# Altium footprint library connector.PcbLib: 227 footprints (part 14 of 15)
Each footprint in its own frame and in the unit in brackets; x right, y up, seen from the top. Pads: shape width x height; smd on the part's side, far side on the other; paste and mask are expansions set on the pad; w line width, h text height; cw(c..) or ccw(c..) is an arc to the next point about the centre after c.
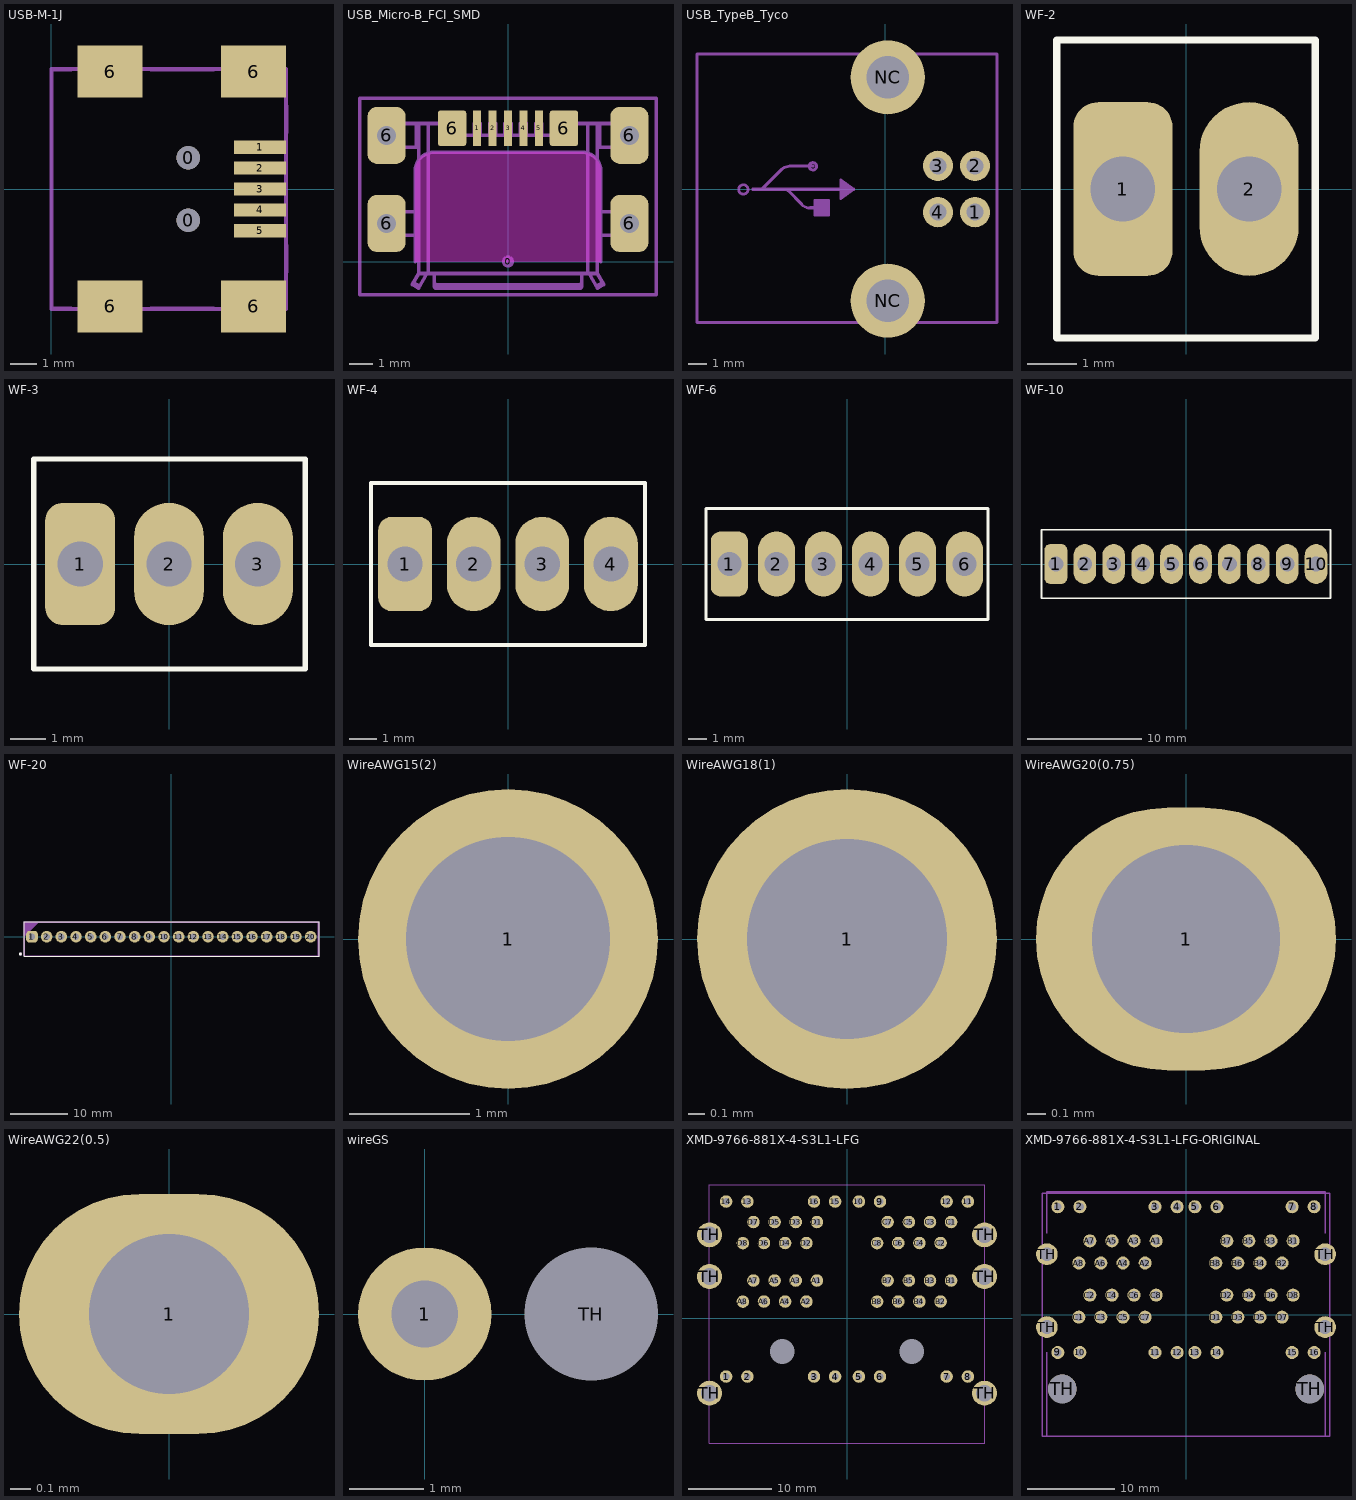
[diagram p13: the footprints below, top view; thin cyan lines are the x and y axes]

## USB-M-1J [mm]
height 4
pads (11):
  round 0.9 hole 0.9: 0(5.25,-1.2) 0(5.25,1.2)
  rect 2x0.5 smd: 1(8.001,1.6) 2(8.001,0.8) 3(8.001,0) 4(8.001,-0.8) 5(8.001,-1.6)
  rect 2.5x2 smd: 6(2.25,-4.5) 6(2.25,4.5) 6(7.75,-4.5) 6(7.75,4.5)
Mechanical 29:
  lines w0.15: 0.762,-4.572 0,-4.572 0,0 0,4.572 0.762,4.572 ; 3.81,-4.572 6.223,-4.572 ; 3.81,4.572 6.223,4.572 ; 9.017,-3.175 9.017,-2.159 ; 9.017,2.159 9.017,3.175 ; 0,-4.6 9,-4.6 9,4.6 0,4.6 0,-4.6
  text ".Designator" at 0.5,-0.3 h1

## USB_Micro-B_FCI_SMD [mm]
height 2.286
pads (12):
  round 0.508 on Mech15: 0(0,0)
  rrect20% 0.35x1.5 smd: 1(-1.3,5.6) 2(-0.65,5.6) 3(0,5.6) 4(0.65,5.6) 5(1.3,5.6)
  rrect50% 1.6x2.4 hole 0.8: 6(-5.1,1.6) 6(-5.1,5.3) 6(5.1,1.6) 6(5.1,5.3)
  rrect20% 1.2x1.5 smd: 6(-2.35,5.6) 6(2.35,5.6)
Top Solder:
  region: 1.905,4.826 1.905,6.35 -1.905,6.35 -1.905,4.826
Keep-Out Layer:
  board cut-out: -3.9,0 -3.9,3.797 -3.9,3.875 -3.869,4.03 -3.809,4.175 -3.721,4.307 -3.61,4.418 -3.479,4.505 -3.333,4.566 -3.179,4.597 -3.1,4.597 3.1,4.597 3.179,4.597 3.333,4.566 3.479,4.505 3.61,4.418 3.721,4.307 3.809,4.175 3.869,4.03 3.9,3.875 3.9,3.797 3.9,0
Mechanical 13:
  lines w0.15: -3.49,-0.651 ccw(c-3.75,-0.501) -3.45,-0.5 ; -3.1,-1.031 ccw(c-3.006,-1.024) -3,-1.118 ; -3.1,-0.881 ccw(c-3.006,-0.874) -3,-0.968 ; -2.577,5.8 cw(c-2.577,5.6) -2.443,5.748 ; -2.229,5.553 ccw(c-2.275,5.8) -2.024,5.8 ; -2.007,5.352 ccw(c-1.873,5.5) -1.873,5.3 ; 1.873,5.3 ccw(c1.873,5.5) 2.007,5.352 ; 2.024,5.8 ccw(c2.275,5.8) 2.229,5.553 ; 2.443,5.748 cw(c2.577,5.6) 2.577,5.8 ; 3,-1.118 ccw(c3.006,-1.024) 3.1,-1.031 ; 3,-0.968 ccw(c3.006,-0.874) 3.1,-0.881 ; 3.45,-0.5 ccw(c3.75,-0.501) 3.49,-0.651
Mechanical 15:
  lines w0.15: -3.9,0 -3.9,3.797 cw(c-3.1,3.797) -3.1,4.597 3.1,4.597 cw(c3.1,3.797) 3.9,3.797 3.9,0 ; -6.223,-1.397 -6.223,6.858 6.223,6.858 6.223,-1.397 -6.223,-1.397
Mechanical 29:
  lines w0.15: -4.85,1.1 -4.85,2.1 ; -4.85,4.8 -4.85,5.8 ; -3.97,-0.881 -3.71,-1.031 ; -3.85,1.1 -3.85,2.1 ; -3.85,4.8 -3.85,5.8 ; -3.75,1.1 -5.25,1.1 -5.25,2.1 -3.75,2.1 ; -3.75,4.8 -5.25,4.8 -5.25,5.8 -2.577,5.8 ; -3.75,5.8 -3.75,-0.5 ; -3.49,-0.651 -3.76,-1.118 -4.02,-0.968 -3.75,-0.5 ; -3.35,-0.5 -3.35,5.8 ; -3.1,-1.031 -3.1,-0.5 ; -2.526,5.793 -2.526,5.8 ; -2.443,5.748 -2.007,5.352 ; -1.873,5.3 1.873,5.3 ; -1.425,5.3 -1.425,5.8 -1.175,5.8 -1.175,5.3 ; -0.775,5.3 -0.775,5.8 -0.525,5.8 -0.525,5.3 ; -0.125,5.3 -0.125,5.8 0.125,5.8 0.125,5.3 ; 0.525,5.3 0.525,5.8 0.775,5.8 0.775,5.3 ; 1.175,5.3 1.175,5.8 1.425,5.8 1.425,5.3 ; 2.007,5.352 2.443,5.748 ; 2.526,5.793 2.526,5.8 ; 2.577,5.8 5.25,5.8 5.25,4.8 3.75,4.8 ; 3.1,-1.031 3.1,-0.5 ; 3.35,-0.5 3.35,5.8 ; 3.49,-0.651 3.76,-1.118 4.02,-0.968 3.75,-0.5 ; 3.71,-1.031 3.97,-0.881 ; 3.75,1.1 5.25,1.1 5.25,2.1 3.75,2.1 ; 3.75,5.8 3.75,-0.5 ; 3.85,1.1 3.85,2.1 ; 3.85,4.8 3.85,5.8 ; 4.85,1.1 4.85,2.1 ; 4.85,4.8 4.85,5.8 ; -3.75,-0.5 -3.1,-0.5 ; -3.1,-0.5 3.1,-0.501 ; 3.1,-0.5 3.75,-0.5 ; -3,-1.118 3,-1.118 3,-0.968 -3,-0.968 -3,-1.118
  text ".Designator" at -3,1.7 h1
3D body "Micro USB B-type mid-mount FCI.STEP": height 2.15, standoff -0.92, extent -5.25,-1.118 5.25,5.8
3D body "USB Micro B plug.STEP": height 4.67, standoff -3.53, extent -5.35,-21.579 5.35,2.921

## USB_TypeB_Tyco [mm]
height 11.1
pads (6):
  round 1.626 hole 0.914: 1(4.83,-1.25) 2(4.83,1.25) 3(2.83,1.25) 4(2.83,-1.25)
  round 4 hole 2.3: NC(0.12,-6.02) NC(0.12,6.02)
Mechanical 29:
  circle w0.15: c-3.91,1.225 r0.2
  circle w0.15: c-7.66,-0.025 r0.254
  region: -1.71,-0.025 -2.41,-0.525 -2.41,0.475
  region: -3.06,-1.4 -3.81,-1.4 -3.81,-0.65 -3.06,-0.65
  lines w0.15: -10.16,7.2 -10.16,-7.2 ; -7.16,-0.025 -2.41,-0.025 ; -7.16,0 -2.41,0 ; -6.613,0.037 -5.613,1.037 cw(c-5.16,0.585) -5.16,1.225 -3.91,1.225 ; -6.613,0.062 -5.613,1.062 ; -5.263,-0.087 -4.513,-0.837 ccw(c-4.06,-0.385) -4.06,-1.025 -3.81,-1.025 ; -5.263,-0.062 -4.513,-0.812 ; -5.16,1.25 -3.91,1.25 ; -4.06,-1 -3.81,-1 ; -2.16,-7.2 -10.16,-7.2 ; 2.34,-7.2 5.74,-7.2 ; -10.16,-7.2 6.015,-7.2 6.015,7.275 -10.16,7.275 -10.16,-7.2 ; -3.81,-1.4 -3.06,-1.4 -3.06,-0.65 -3.81,-0.65 -3.81,-1.4 ; -3.81,-1.375 -3.81,-0.625 -3.06,-0.625 -3.06,-1.375 -3.81,-1.375 ; -2.41,-0.525 -1.71,-0.025 -2.41,0.475 -2.41,-0.525 ; -2.41,-0.5 -1.71,0 -2.41,0.5 -2.41,-0.5
  text ".Designator" at -7.66,3.7 h1
3D body "User Library-JST_UBB-4R-D14T-4D.step": height 11.6, standoff -3.12, extent -10.16,-7.475 6.14,7.425

## WF-2 [mm]
pads (2):
  rrect50% 2x3.5 hole 1.3: 1(-1.27,0)
  oval 2x3.5 hole 1.3: 2(1.27,0)
Top Overlay:
  lines w0.15: -2.6,-3 -2.6,3 2.6,3 2.6,-3 -2.6,-3
3D body "SNP389.STEP": height 11.4, standoff -3.4, extent 0,-2.9 2.54,2.9
3D body "SNP389.STEP": height 11.4, standoff -3.4, extent -2.54,-2.9 0,2.9

## WF-3 [mm]
pads (3):
  rrect50% 2x3.5 hole 1.3: 1(-2.54,0)
  oval 2x3.5 hole 1.3: 2(0,0) 3(2.54,0)
Top Overlay:
  lines w0.15: -3.87,-3 -3.87,3 3.9,3 3.9,-3 -3.87,-3
3D body "SNP389.STEP": height 11.4, standoff -3.4, extent 1.27,-2.9 3.81,2.9
3D body "SNP389.STEP": height 11.4, standoff -3.4, extent -1.27,-2.9 1.27,2.9
3D body "SNP389.STEP": height 11.4, standoff -3.4, extent -3.81,-2.9 -1.27,2.9

## WF-4 [mm]
pads (4):
  rrect50% 2x3.5 hole 1.3: 1(-3.81,0)
  oval 2x3.5 hole 1.3: 2(-1.27,0) 3(1.27,0) 4(3.81,0)
Top Overlay:
  lines w0.15: -5.08,-3 5.08,-3 5.08,3 -5.08,3 -5.08,-3
3D body "SNP389.STEP": height 11.4, standoff -3.4, extent -5.08,-2.9 -2.54,2.9
3D body "SNP389.STEP": height 11.4, standoff -3.4, extent -2.54,-2.9 0,2.9
3D body "SNP389.STEP": height 11.4, standoff -3.4, extent 0,-2.9 2.54,2.9
3D body "SNP389.STEP": height 11.4, standoff -3.4, extent 2.54,-2.9 5.08,2.9

## WF-6 [mm]
pads (6):
  rrect50% 2x3.5 hole 1.3: 1(-6.35,0)
  oval 2x3.5 hole 1.3: 2(-3.81,0) 3(-1.27,0) 4(1.27,0) 5(3.81,0) 6(6.35,0)
Top Overlay:
  lines w0.15: -7.62,-3 7.62,-3 7.62,3 -7.62,3 -7.62,-3
3D body "SNP389.STEP": height 11.4, standoff -3.4, extent 5.08,-2.9 7.62,2.9
3D body "SNP389.STEP": height 11.4, standoff -3.4, extent 2.54,-2.9 5.08,2.9
3D body "SNP389.STEP": height 11.4, standoff -3.4, extent -7.62,-2.9 -5.08,2.9
3D body "SNP389.STEP": height 11.4, standoff -3.4, extent -5.08,-2.9 -2.54,2.9
3D body "SNP389.STEP": height 11.4, standoff -3.4, extent -2.54,-2.9 0,2.9
3D body "SNP389.STEP": height 11.4, standoff -3.4, extent 0,-2.9 2.54,2.9

## WF-10 [mm]
pads (10):
  rrect50% 2x3.5 hole 1.3: 1(-11.43,0)
  oval 2x3.5 hole 1.3: 2(-8.89,0) 3(-6.35,0) 4(-3.81,0) 5(-1.27,0) 6(1.27,0) 7(3.81,0) 8(6.35,0) 9(8.89,0) 10(11.43,0)
Top Overlay:
  lines w0.15: -12.7,-3 12.7,-3 12.7,3 -12.7,3 -12.7,-3
3D body "SNP389.STEP": height 11.4, standoff -3.4, extent 0,-2.9 2.54,2.9
3D body "SNP389.STEP": height 11.4, standoff -3.4, extent -2.54,-2.9 0,2.9
3D body "SNP389.STEP": height 11.4, standoff -3.4, extent -12.7,-2.9 -10.16,2.9
3D body "SNP389.STEP": height 11.4, standoff -3.4, extent -10.16,-2.9 -7.62,2.9
3D body "SNP389.STEP": height 11.4, standoff -3.4, extent -7.62,-2.9 -5.08,2.9
3D body "SNP389.STEP": height 11.4, standoff -3.4, extent -5.08,-2.9 -2.54,2.9
3D body "SNP389.STEP": height 11.4, standoff -3.4, extent 2.54,-2.9 5.08,2.9
3D body "SNP389.STEP": height 11.4, standoff -3.4, extent 5.08,-2.9 7.62,2.9
3D body "SNP389.STEP": height 11.4, standoff -3.4, extent 7.62,-2.9 10.16,2.9
3D body "SNP389.STEP": height 11.4, standoff -3.4, extent 10.16,-2.9 12.7,2.9

## WF-20 [mm]
pads (22):
  round 0.5 on Top Overlay: 0(-26.13,-3)
  round 0.5 on Mech29: 0(-26.13,-3)
  rrect50% 2x2 hole 1.1: 1(-24.13,0)
  round 2 hole 1.1: 2(-21.59,0) 3(-19.05,0) 4(-16.51,0) 5(-13.97,0) 6(-11.43,0) 7(-8.89,0) 8(-6.35,0) 9(-3.81,0) 10(-1.27,0) 11(1.27,0) 12(3.81,0) 13(6.35,0) 14(8.89,0) 15(11.43,0) 16(13.97,0) 17(16.51,0) 18(19.05,0) 19(21.59,0) 20(24.13,0)
Top Overlay:
  lines w0.15: -25.48,-3.4 25.57,-3.4 25.57,2.6 -25.48,2.6 -25.48,-3.4
Mechanical 1:
  lines w0.15: -25.37,-3.3 -25.37,2.5 25.47,2.5 25.47,-3.3 -25.37,-3.3
Mechanical 29:
  region: -25.48,2.6 -22.88,2.6 -25.48,0
  lines w0.15: -25.48,-3.4 -25.48,2.6 25.57,2.6 25.57,-3.4 -25.48,-3.4
  text ".Designator" at -3.5,-0.3 h1
3D body "WF-20.stp": height 11.51, standoff -3.29, extent -25.37,-3.3 25.47,2.5

## WireAWG15(2) [mm]
pads (1):
  round 2.5 hole 1.7: 1(0,0)

## WireAWG18(1) [mm]
pads (1):
  round 1.8 hole 1.2: 1(0,0)

## WireAWG20(0.75) [mm]
pads (1):
  oval 1.6x1.4 hole 1: 1(0,0)

## WireAWG22(0.5) [mm]
pads (1):
  oval 1.5x1.2 hole 0.8: 1(0,0)

## wireGS [mm]
pads (2):
  round 1.8 hole 0.9: 1(0,0)
  round 1 hole 1.8 unplated: TH(2.25,0)
Mechanical 13:
  circle w0.15: c0,0 r0.762
3D body "wireplusGS6.STEP": height 3.05, standoff -4.3, extent -0.75,-5 51.303,5

## XMD-9766-881X-4-S3L1-LFG [mm]
pads (56):
  round 1.5 hole 0.8: 1(-14.5,-7) 2(-11.96,-7) 3(-3.96,-7) 4(-1.42,-7) 5(1.42,-7) 6(3.96,-7) 7(11.96,-7) 8(14.5,-7) 9(3.96,14) 10(1.42,14) 11(14.5,14) 12(11.96,14) 13(-11.96,14) 14(-14.5,14) 15(-1.42,14) 16(-3.96,14) A1(-3.61,4.52) A2(-4.88,2) A3(-6.15,4.52) A4(-7.42,2) A5(-8.69,4.52) A6(-9.96,2) A7(-11.23,4.52) A8(-12.5,1.98) B1(12.5,4.52) B2(11.23,2) B3(9.96,4.52) B4(8.69,2) B5(7.42,4.52) B6(6.15,2) B7(4.88,4.52) B8(3.61,1.98) C1(12.5,11.54) C2(11.23,9.02) C3(9.96,11.54) C4(8.69,9.02) C5(7.42,11.54) C6(6.15,9.02) C7(4.88,11.54) C8(3.61,9) D1(-3.61,11.54) D2(-4.88,9.02) D3(-6.15,11.54) D4(-7.42,9.02) D5(-8.69,11.54) D6(-9.96,9.02) D7(-11.23,11.54) D8(-12.5,9)
  round 0 hole 3: 4(-7.77,-4) 4(7.77,-4)
  round 3 hole 2: TH(-16.5,-9) TH(-16.5,5) TH(-16.5,10) TH(16.5,-9) TH(16.5,5) TH(16.5,10)
Mechanical 29:
  lines w0.15: -16.5,-15 16.5,-15 16.5,16 -16.5,16 -16.5,-15
  text ".Designator" at -3.5,-0.3 h1

## XMD-9766-881X-4-S3L1-LFG-ORIGINAL [mm]
height 25.4
pads (54):
  round 1.5 hole 0.9: 1(-14.74,12.44) 2(-12.2,12.44) 3(-3.56,12.44) 4(-1.02,12.44) 5(1.02,12.44) 6(3.56,12.44) 7(12.2,12.44) 8(14.74,12.44) 9(-14.74,-4.32) 10(-12.2,-4.32) 11(-3.56,-4.32) 12(-1.02,-4.32) 13(1.02,-4.32) 14(3.56,-4.32) 15(12.2,-4.32) 16(14.74,-4.32) A1(-3.435,8.51) A2(-4.705,5.97) A3(-5.975,8.51) A4(-7.245,5.97) A5(-8.515,8.51) A6(-9.785,5.97) A7(-11.055,8.51) A8(-12.325,5.97) B1(12.315,8.51) B2(11.045,5.97) B3(9.775,8.51) B4(8.505,5.97) B5(7.235,8.51) B6(5.965,5.97) B7(4.695,8.51) B8(3.425,5.97) C1(-12.325,-0.26) C2(-11.055,2.28) C3(-9.785,-0.26) C4(-8.515,2.28) C5(-7.245,-0.26) C6(-5.975,2.28) C7(-4.705,-0.26) C8(-3.435,2.28) D1(3.425,-0.26) D2(4.695,2.28) D3(5.965,-0.26) D4(7.235,2.28) D5(8.505,-0.26) D6(9.775,2.28) D7(11.045,-0.26) D8(12.315,2.28)
  round 2.5 hole 1.6: TH(-16,-1.4) TH(-16,6.98) TH(16,-1.4) TH(16,6.98)
  round 3.3 hole 3.3: TH(-14.225,-8.51) TH(14.225,-8.51)
Mechanical 29:
  lines w0.15: -16,-4.32 -16,-13.97 16,-13.97 16,-4.32 ; -16,9.4 -16,14.18 16,14.18 16,9.4 ; -16.51,-13.97 -16.51,13.97 16.51,13.97 16.51,-13.97 -16.51,-13.97
  text ".Designator" at -3.5,-0.3 h1